# Altium footprint library MyPcbLib.PcbLib: 657 footprints (part 34 of 42)
Each footprint in its own frame and in the unit in brackets; x right, y up, seen from the top. Pads: shape width x height; smd on the part's side, far side on the other; paste and mask are expansions set on the pad; w line width, h text height; cw(c..) or ccw(c..) is an arc to the next point about the centre after c.
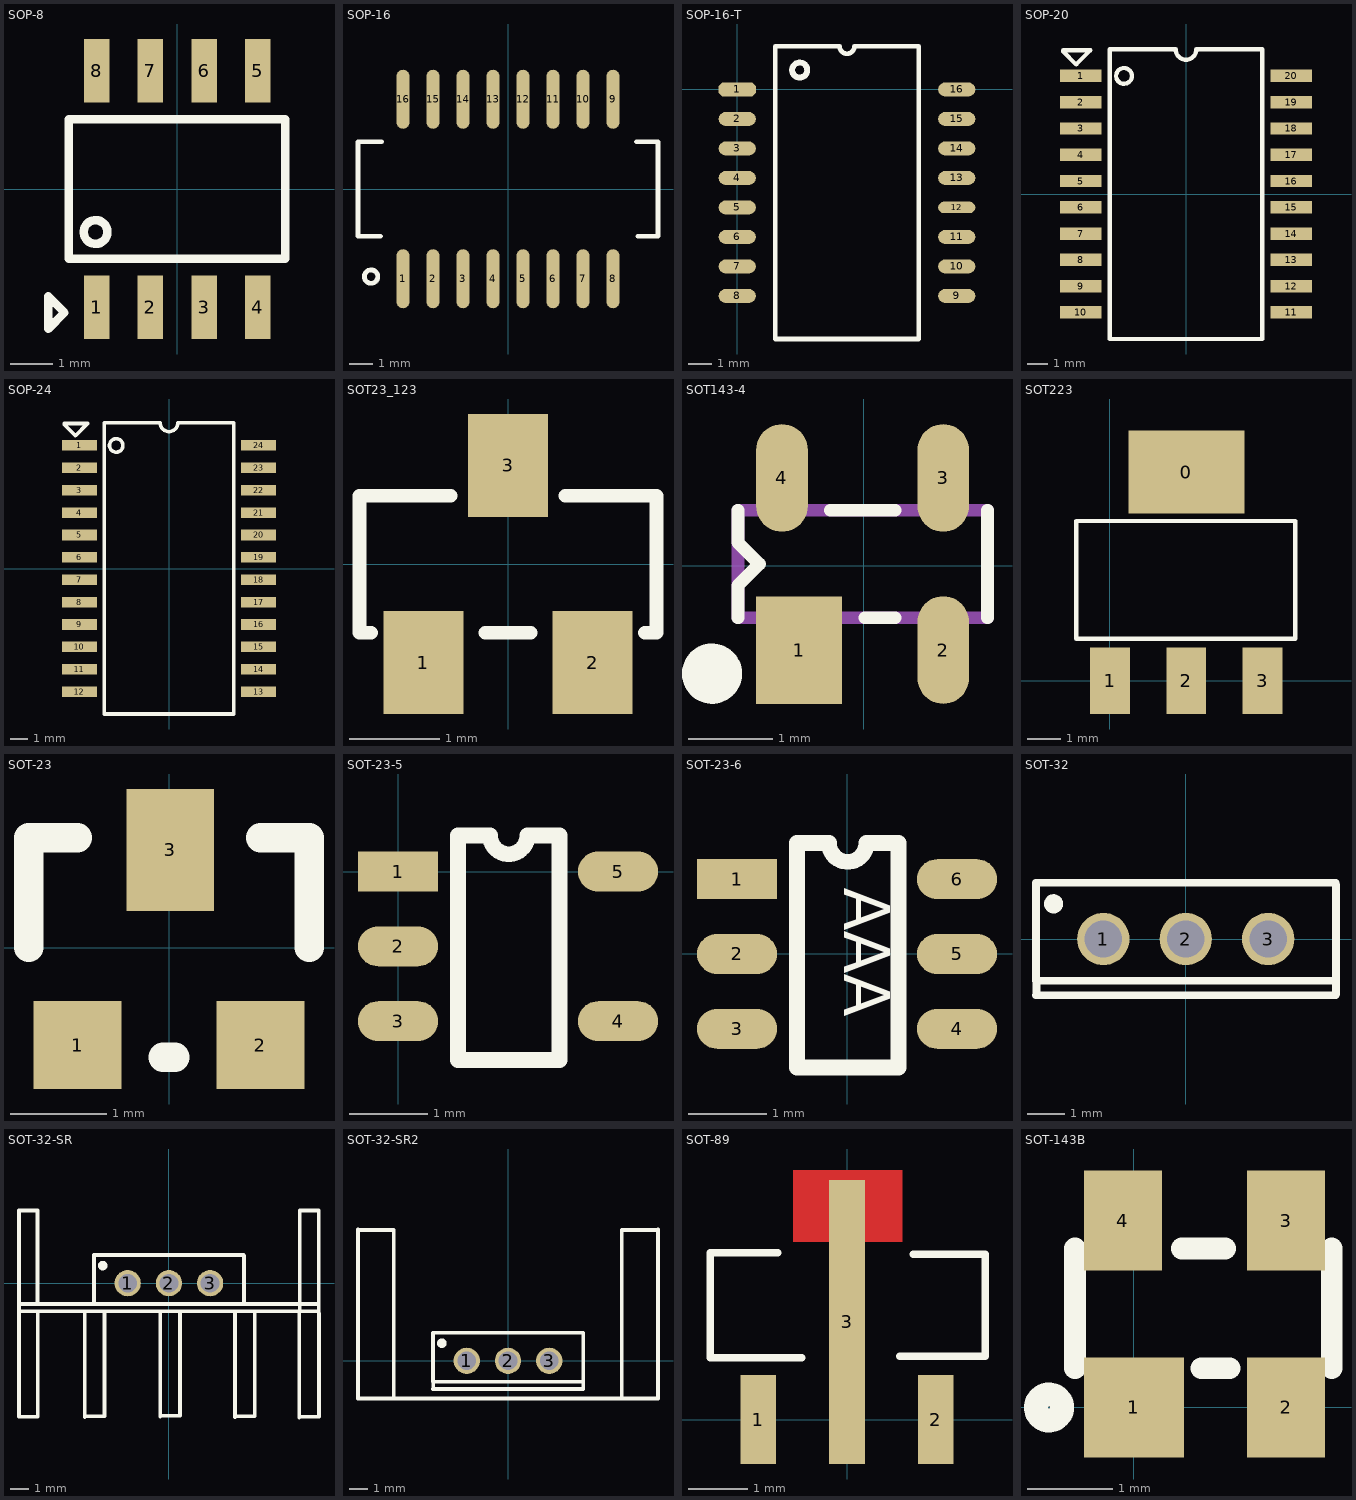
[diagram p33: the footprints below, top view; thin cyan lines are the x and y axes]

## SOP-8 [mm]
pads (8):
  rect 0.6x1.5 smd: 1(-1.905,-2.794) 2(-0.635,-2.794) 3(0.635,-2.794) 4(1.905,-2.794) 5(1.905,2.794) 6(0.635,2.794) 7(-0.635,2.794) 8(-1.905,2.794)
Top Overlay:
  circle w0.203: c-1.932,-1.016 r0.281
  lines w0.203: -3.048,-3.302 -3.048,-2.54 -2.667,-2.921 -3.048,-3.302 ; -2.565,-1.651 -2.565,1.651 2.555,1.651 2.555,-1.651 -2.565,-1.651
3D body: height 1.7, standoff 0, extent -2.462,-2.848 2.438,3.152

## SOP-16 [mm] "FOR H1102NL"
pads (16):
  oval 0.559x2.5 smd: 1(-4.445,-3.8) 2(-3.175,-3.8) 3(-1.905,-3.8) 4(-0.635,-3.8) 5(0.635,-3.8) 6(1.905,-3.8) 7(3.175,-3.8) 8(4.445,-3.8) 9(4.445,3.8) 10(3.175,3.8) 11(1.905,3.8) 12(0.635,3.8) 13(-0.635,3.8) 14(-1.905,3.8) 15(-3.175,3.8) 16(-4.445,3.8)
Top Overlay:
  circle w0.203: c-5.796,-3.708 r0.284
  lines w0.203: -5.404,-2 -6.35,-2 -6.35,2 -5.341,2 ; 5.442,2 6.35,2 6.35,-2 5.493,-2
3D body: height -0.4, standoff -5.6, extent -5.105,-3.935 5.095,3.986

## SOP-16-T [mm]
pads (16):
  oct 1.6x0.6 smd: 1(0,0)
  oval 1.6x0.6 smd: 2(0,-1.27) 3(0,-2.54) 4(0,-3.81) 5(0,-5.08) 6(0,-6.35) 7(0,-7.62) 8(0,-8.89) 9(9.45,-8.89) 10(9.45,-7.62) 11(9.45,-6.35) 13(9.45,-3.81) 14(9.45,-2.54) 15(9.45,-1.27) 16(9.45,0)
  oval 1.6x0.5 smd: 12(9.45,-5.08)
Top Overlay:
  lines w0.2: 1.635,-10.745 1.635,1.855 4.407,1.855 ccw(c4.725,1.855) 5.042,1.855 7.815,1.855 7.815,-10.745 1.635,-10.745
  lines w0.254: 2.498,0.573 cw(c2.688,0.836) 2.525,0.555

## SOP-20 [mm]
pads (20):
  rect 2x0.6 smd: 1(-5.08,5.715) 2(-5.08,4.445) 3(-5.08,3.175) 4(-5.08,1.905) 5(-5.08,0.635) 6(-5.08,-0.635) 7(-5.08,-1.905) 8(-5.08,-3.175) 9(-5.08,-4.445) 10(-5.08,-5.715) 11(5.08,-5.715) 12(5.08,-4.445) 13(5.08,-3.175) 14(5.08,-1.905) 15(5.08,-0.635) 16(5.08,0.635) 17(5.08,1.905) 18(5.08,3.175) 19(5.08,4.445) 20(5.08,5.715)
Top Overlay:
  circle w0.203: c-2.997,5.715 r0.381
  lines w0.203: -5.931,6.896 -5.309,6.274 -4.623,6.96 -5.931,6.96 ; -3.683,-7 3.683,-7 3.683,7 0.5,7 cw(c0,7) -0.5,7 -3.683,7 -3.683,-7
3D body: height 2.85, standoff 0.02, extent -5.215,-6.35 5.385,6.35

## SOP-24 [mm]
pads (24):
  rect 2x0.6 smd: 1(-5.08,6.985) 2(-5.08,5.715) 3(-5.08,4.445) 4(-5.08,3.175) 5(-5.08,1.905) 6(-5.08,0.635) 7(-5.08,-0.635) 8(-5.08,-1.905) 9(-5.08,-3.175) 10(-5.08,-4.445) 11(-5.08,-5.715) 12(-5.08,-6.985) 13(5.08,-6.985) 14(5.08,-5.715) 15(5.08,-4.445) 16(5.08,-3.175) 17(5.08,-1.905) 18(5.08,-0.635) 19(5.08,0.635) 20(5.08,1.905) 21(5.08,3.175) 22(5.08,4.445) 23(5.08,5.715) 24(5.08,6.985)
Top Overlay:
  circle w0.203: c-2.997,6.985 r0.381
  lines w0.203: -5.931,8.166 -5.309,7.544 -4.623,8.23 -5.931,8.23 ; -3.683,-8.255 3.683,-8.255 3.683,8.27 0.5,8.27 cw(c0,8.27) -0.5,8.27 -3.683,8.27 -3.683,-8.255
3D body: height 2.85, standoff 0.02, extent -5.469,-7.922 5.131,7.618

## SOT23_123 [mil]
pads (3):
  rect 35x45 smd: 1(-37,-43) 2(37,-43) 3(0,43.31)
Top Overlay:
  lines w6: -60,-30 -65,-30 -65,30 -25,30 ; -10,-30 10,-30 ; 25,30 65,30 65,-30 60,-30

## SOT143-4 [mil]
pads (4):
  rect 40x50 smd: 1(-30.05,-39.25)
  oval 24x50 smd: 2(36.95,-39.25) 3(36.95,40.75) 4(-38.05,40.75)
Top Overlay:
  circle w14: c-70.55,-50.25 r7
  lines w6: -58.55,-24.25 -58.55,-9.25 -48.55,0.75 -58.55,10.75 -58.55,25.75 ; -15.55,25.75 14.45,25.75 ; 0.45,-24.25 14.45,-24.25 ; 57.45,-24.25 57.45,25.75
Mechanical 1:
  lines w6: -58.55,-24.25 57.45,-24.25 57.45,25.75 -58.55,25.75 -58.55,-24.25

## SOT223 [mm]
pads (4):
  rect 3.5x2.5 smd: 0(2.302,6.298)
  rect 1.2x2 smd: 1(0.002,-0.002) 2(2.302,-0.002) 3(4.602,-0.002)
Top Overlay:
  lines w0.127: -1.014,1.268 5.59,1.268 5.59,4.824 -1.014,4.824 -1.014,1.268

## SOT-23 [mil]
pads (3):
  rect 36x36 smd: 1(-37.5,-40) 2(37.5,-40)
  rect 36x50 smd: 3(0.5,40)
Top Overlay:
  lines w12: -57.5,0 -57.5,45 -37.5,45 ; -2.5,-45 2.5,-45 ; 37.5,45 57.5,45 57.5,0
3D body: height 47.24, standoff 0, extent -55,-53 59.17,57.24

## SOT-23-5 [mil]
height 9.5
pads (5):
  rect 40x20 smd: 1(0,0)
  oval 40x20 smd: 2(0,-37.4) 3(0,-74.8) 4(110,-74.8) 5(110,0)
Top Overlay:
  lines w7.87: 30,18 30,-94.2 80.7,-94.2 80.7,18 ; 46,18 ccw(c55.35,18) 64.7,18
  lines w8: 30,18 46,18 ; 64.7,18 80.7,18

## SOT-23-6 [mil]
height 9.5
pads (6):
  rect 40x20 smd: 1(-55,37.4)
  oval 40x20 smd: 2(-55,0) 3(-55,-37.4) 4(55,-37.4) 5(55,0) 6(55,37.4)
Top Overlay:
  lines w7.87: -25,55.4 -25,-56.8 25.7,-56.8 25.7,55.4 ; -9,55.4 ccw(c0.35,55.4) 9.7,55.4
  lines w8: -25,55.4 -9,55.4 ; 9.7,55.4 25.7,55.4
  text "AAA" at -9,33 h39.37

## SOT-32 [mm]
pads (3):
  round 1.4 hole 1: 1(-2.2,0) 2(0,0) 3(2.2,0)
Top Overlay:
  circle w0.254: c-3.531,0.94 r0.13
  lines w0.203: -4,-1.5 4,-1.5 ; -3.988,-1.448 -3.988,-1.118 ; 4,-1.118 -4,-1.118 -4,1.5 4,1.5 ; 4.013,-1.473 4.013,-1.067 ; 4.013,-1.118 4.013,1.448

## SOT-32-SR [mm]
pads (3):
  round 1.4 hole 1: 1(-2.2,0) 2(0,0) 3(2.2,0)
Top Overlay:
  circle w0.254: c-3.531,0.94 r0.13
  lines w0.203: -8,-1.5 8,-1.5 ; -8,-1.118 8,-1.118 ; -7.01,-1.092 -7.01,3.861 ; -7,-1.626 -7,-7.126 -8,-7.126 -8,3.874 -7,3.874 ; -4.496,-7.137 -4.496,-1.524 ; -4.444,-7.1 -3.444,-7.1 -3.444,-1.6 ; -4,-1.118 -4,1.5 4,1.5 ; -0.457,-7.112 -0.457,-1.499 ; -0.405,-7.075 0.595,-7.075 0.595,-1.575 ; 3.531,-7.137 3.531,-1.524 ; 3.582,-7.1 4.582,-7.1 4.582,-1.6 ; 4.013,-1.118 4.013,1.448 ; 6.96,-7.163 6.96,-1.549 ; 6.985,-1.473 6.985,3.835 ; 7,3.874 8,3.874 8,-7.126 ; 7.011,-7.126 8.011,-7.126 8.011,-1.626

## SOT-32-SR2 [mm]
pads (3):
  round 1.4 hole 1: 1(-2.2,0) 2(0,0) 3(2.2,0)
Top Overlay:
  circle w0.254: c-3.531,0.94 r0.13
  lines w0.203: -8.001,-2.007 8.001,-2.007 ; -8,-2 -8,7 ; -7.95,6.985 -6.096,6.985 -6.096,-1.93 ; -4,-1.5 4,-1.5 ; -3.988,-1.448 -3.988,-1.118 ; 4,-1.118 -4,-1.118 -4,1.5 4,1.5 ; 4.013,-1.473 4.013,-1.067 ; 4.013,-1.118 4.013,1.448 ; 6.071,-1.93 6.071,6.985 7.925,6.985 ; 8,-2 8,7

## SOT-89 [mm]
pads (3):
  rect 0.6x1.5 smd: 1(-1.5,0) 2(1.5,0)
  rect 0.6x4.8 smd: 3(0,1.651)
Top Layer:
  rectangle: -0.914,2.997 0.94,4.216
Top Overlay:
  lines w0.127: -2.311,1.041 -0.762,1.041 ; -2.311,1.067 -2.311,2.794 ; -2.311,2.819 -1.168,2.819 ; 0.889,1.067 2.311,1.067 ; 1.118,2.794 2.337,2.794 2.337,1.067
Top Solder:
  rectangle: -1.016,2.896 1.041,4.318
3D body: height 1.59, standoff -0.02, extent -2.293,-0.352 2.307,3.898

## SOT-143B [mil]
height 9.5
pads (4):
  rect 46x46 smd: 1(0,0)
  rect 36x46 smd: 2(70,0) 3(70,86) 4(-5,86)
Top Overlay:
  circle w11: c-39,0 r6
  lines w10: -27.11,18 -27.11,73.12 ; 22,73.12 42,73.12 ; 31,18 44,18 ; 91,18 91,73.12